# Altium footprint library 3M THD.PcbLib: 163 footprints (part 12 of 14) (continued)
## 3M_N3764-6302RB [mm] "3M, 3000 Series, 64 Contacts - Pitch 2.54mm - Straight Four-Wall Header (Black) With Long Roll Pin Latch/Ejectors" (continued)
  text "64" at 40.605,1.727 h1.02
  text "1" at -41.707,-2.921 h1.02
3D body "3M_N3764-6302RB.stp": height 19.96, standoff -2.84, extent -61.419,-4.318 61.419,4.318

## 3M_N3764-6302RB_a [mm] "3M, 3000 Series, 64 Contacts - Pitch 2.54mm - Straight Four-Wall Header (Black) With Long Roll Pin Latch/Ejectors"
height 27.2
pads (66):
  round 1.6 hole 0.9: 1(-39.37,-1.27) 2(-39.37,1.27) 3(-36.83,-1.27) 4(-36.83,1.27) 5(-34.29,-1.27) 6(-34.29,1.27) 7(-31.75,-1.27) 8(-31.75,1.27) 9(-29.21,-1.27) 10(-29.21,1.27) 11(-26.67,-1.27) 12(-26.67,1.27) 13(-24.13,-1.27) 14(-24.13,1.27) 15(-21.59,-1.27) 16(-21.59,1.27) 17(-19.05,-1.27) 18(-19.05,1.27) 19(-16.51,-1.27) 20(-16.51,1.27) 21(-13.97,-1.27) 22(-13.97,1.27) 23(-11.43,-1.27) 24(-11.43,1.27) 25(-8.89,-1.27) 26(-8.89,1.27) 27(-6.35,-1.27) 28(-6.35,1.27) 29(-3.81,-1.27) 30(-3.81,1.27) 31(-1.27,-1.27) 32(-1.27,1.27) 33(1.27,-1.27) 34(1.27,1.27) 35(3.81,-1.27) 36(3.81,1.27) 37(6.35,-1.27) 38(6.35,1.27) 39(8.89,-1.27) 40(8.89,1.27) 41(11.43,-1.27) 42(11.43,1.27) 43(13.97,-1.27) 44(13.97,1.27) 45(16.51,-1.27) 46(16.51,1.27) 47(19.05,-1.27) 48(19.05,1.27) 49(21.59,-1.27) 50(21.59,1.27) 51(24.13,-1.27) 52(24.13,1.27) 53(26.67,-1.27) 54(26.67,1.27) 55(29.21,-1.27) 56(29.21,1.27) 57(31.75,-1.27) 58(31.75,1.27) 59(34.29,-1.27) 60(34.29,1.27) 61(36.83,-1.27) 62(36.83,1.27) 63(39.37,-1.27) 64(39.37,1.27)
  round 4.6 hole 2.6: MTG1(-48.31,-0.254) MTG2(48.31,-0.254)
Top Overlay:
  lines w0.2: -50.292,-2 -50.292,-4.318 50.292,-4.318 50.292,-2 ; -50.292,1.7 -50.292,4.3 50.292,4.3 50.292,1.7 ; -43.307,-3.175 43.307,-3.175 43.307,3.175 -43.307,3.175 -43.307,-3.175 ; -40.64,-3.175 -39.37,-4.318 -38.1,-3.175 -40.64,-3.175
  text "1" at -41.707,-2.921 h1.02
  text "64" at 40.605,1.727 h1.02
Mechanical 8:
  drawing of 276 lines, arcs and shapes, not listed
Mechanical 14:
  circle w0.1: c-48.324,-0.254 r1.27
  circle w0.1: c48.324,-0.254 r1.27
  lines w0.1: -50.292,-3.175 -46.964,-3.175 ; -49.324,-0.254 -48.324,-0.254 ; -48.324,-1.254 -48.324,-0.254 ; -48.324,0.746 -48.324,-0.254 ; -47.324,-0.254 -48.324,-0.254 ; -46.964,-4.318 -46.964,-1.727 ; -46.964,1.27 -46.964,4.318 ; -46.122,-4.318 -46.122,-1.727 ; -46.122,1.27 -46.122,4.318 ; -43.689,-4.318 -43.688,-1.727 ; -43.307,-1.727 -43.307,-3.175 ; -43.307,1.27 -43.307,3.175 ; -36.519,-4.318 -36.519,-3.175 ; -34.601,-4.318 -34.601,-3.175 ; -3.302,-4.318 -3.302,-3.175 ; 0.762,-4.318 0.762,-3.175 ; 37.141,-4.318 37.141,-3.175 ; 39.059,-4.318 39.059,-3.175 ; 42.846,-4.318 42.846,-3.175 ; 42.846,3.175 42.846,4.318 ; 43.307,-1.727 43.307,-3.175 ; 43.307,1.27 43.307,3.175 ; 43.688,1.27 43.688,4.318 ; 43.729,-4.318 43.729,-1.727 ; 46.122,-4.318 46.122,-1.727 ; 46.122,1.27 46.122,4.318 ; 46.964,-4.318 46.964,-1.727 40.005,-1.727 40.005,1.27 46.964,1.27 46.964,4.318 ; 46.964,-3.175 50.292,-3.175 ; 46.964,3.175 50.292,3.175 ; 47.324,-0.254 48.324,-0.254 ; 48.324,-1.254 48.324,-0.254 ; 48.324,0.746 48.324,-0.254 ; 49.324,-0.254 48.324,-0.254 ; -50.292,-4.318 -50.292,4.318 ; -50.292,-4.318 -50.292,4.318 ; -50.292,-4.318 -50.292,4.318 ; -50.292,-4.318 50.292,-4.318 ; -50.292,4.318 50.292,4.318 ; -43.307,-3.175 -43.307,3.175 ; -43.307,-3.175 -43.307,3.175 ; -43.307,-3.175 43.307,-3.175 ; -43.307,3.175 43.307,3.175 ; 43.307,-3.175 43.307,3.175 ; 43.307,-3.175 43.307,3.175 ; 50.292,-4.318 50.292,4.318 ; 50.292,-4.318 50.292,4.318 ; -50.292,3.175 -46.964,3.175 -50.292,3.175 ; -49.848,-1.134 -49.848,0.626 -48.324,1.506 -46.8,0.626 -46.8,-1.134 -48.324,-2.014 -49.848,-1.134 ; -43.688,1.27 -43.688,4.318 -43.688,1.27 ; -42.846,-4.318 -42.846,-3.175 -42.846,-4.318 ; -42.846,3.175 -42.846,4.318 -42.846,3.175 ; 46.8,-1.134 46.8,0.626 48.324,1.506 49.848,0.626 49.848,-1.134 48.324,-2.014 46.8,-1.134
  text "1" at -41.707,-2.921 h1.02
  text "64" at 40.605,1.727 h1.02
3D body "3M_N3764-6302RB_a.stp": height 27.18, standoff -2.84, extent -50.292,-4.318 50.292,4.318

## 3M_N3764-D302RB [mm] "3M, 3000 Series, 2x64 Contacts - Pitch 2.54mm - Right Angle Four-Wall Condo Header (Black) With Long Roll Pin Latch/Ejectors"
height 15.5
pads (130):
  round 1.7 hole 1: 1L(-39.37,1.27) 1U(-39.37,-3.81) 2L(-39.37,3.81) 2U(-39.37,-1.27) 3L(-36.83,1.27) 3U(-36.83,-3.81) 4L(-36.83,3.81) 4U(-36.83,-1.27) 5L(-34.29,1.27) 5U(-34.29,-3.81) 6L(-34.29,3.81) 6U(-34.29,-1.27) 7L(-31.75,1.27) 7U(-31.75,-3.81) 8L(-31.75,3.81) 8U(-31.75,-1.27) 9L(-29.21,1.27) 9U(-29.21,-3.81) 10L(-29.21,3.81) 10U(-29.21,-1.27) 11L(-26.67,1.27) 11U(-26.67,-3.81) 12L(-26.67,3.81) 12U(-26.67,-1.27) 13L(-24.13,1.27) 13U(-24.13,-3.81) 14L(-24.13,3.81) 14U(-24.13,-1.27) 15L(-21.59,1.27) 15U(-21.59,-3.81) 16L(-21.59,3.81) 16U(-21.59,-1.27) 17L(-19.05,1.27) 17U(-19.05,-3.81) 18L(-19.05,3.81) 18U(-19.05,-1.27) 19L(-16.51,1.27) 19U(-16.51,-3.81) 20L(-16.51,3.81) 20U(-16.51,-1.27) 21L(-13.97,1.27) 21U(-13.97,-3.81) 22L(-13.97,3.81) 22U(-13.97,-1.27) 23L(-11.43,1.27) 23U(-11.43,-3.81) 24L(-11.43,3.81) 24U(-11.43,-1.27) 25L(-8.89,1.27) 25U(-8.89,-3.81) 26L(-8.89,3.81) 26U(-8.89,-1.27) 27L(-6.35,1.27) 27U(-6.35,-3.81) 28L(-6.35,3.81) 28U(-6.35,-1.27) 29L(-3.81,1.27) 29U(-3.81,-3.81) 30L(-3.81,3.81) 30U(-3.81,-1.27) 31L(-1.27,1.27) 31U(-1.27,-3.81) 32L(-1.27,3.81) 32U(-1.27,-1.27) 33L(1.27,1.27) 33U(1.27,-3.81) 34L(1.27,3.81) 34U(1.27,-1.27) 35L(3.81,1.27) 35U(3.81,-3.81) 36L(3.81,3.81) 36U(3.81,-1.27) 37L(6.35,1.27) 37U(6.35,-3.81) 38L(6.35,3.81) 38U(6.35,-1.27) 39L(8.89,1.27) 39U(8.89,-3.81) 40L(8.89,3.81) 40U(8.89,-1.27) 41L(11.43,1.27) 41U(11.43,-3.81) 42L(11.43,3.81) 42U(11.43,-1.27) 43L(13.97,1.27) 43U(13.97,-3.81) 44L(13.97,3.81) 44U(13.97,-1.27) 45L(16.51,1.27) 45U(16.51,-3.81) 46L(16.51,3.81) 46U(16.51,-1.27) 47L(19.05,1.27) 47U(19.05,-3.81) 48L(19.05,3.81) 48U(19.05,-1.27) 49L(21.59,1.27) 49U(21.59,-3.81) 50L(21.59,3.81) 50U(21.59,-1.27) 51L(24.13,1.27) 51U(24.13,-3.81) 52L(24.13,3.81) 52U(24.13,-1.27) 53L(26.67,1.27) 53U(26.67,-3.81) 54L(26.67,3.81) 54U(26.67,-1.27) 55L(29.21,1.27) 55U(29.21,-3.81) 56L(29.21,3.81) 56U(29.21,-1.27) 57L(31.75,1.27) 57U(31.75,-3.81) 58L(31.75,3.81) 58U(31.75,-1.27) 59L(34.29,1.27) 59U(34.29,-3.81) 60L(34.29,3.81) 60U(34.29,-1.27) 61L(36.83,1.27) 61U(36.83,-3.81) 62L(36.83,3.81) 62U(36.83,-1.27) 63L(39.37,1.27) 63U(39.37,-3.81) 64L(39.37,3.81) 64U(39.37,-1.27)
  round 4.6 hole 2.6: MTG1(-45.275,3.07) MTG2(45.275,3.07)
Top Overlay:
  circle w0.2: c-45.006,8.915 r0.953
  circle w0.2: c-45.006,8.915 r0.953
  circle w0.2: c45.006,8.915 r0.953
  circle w0.2: c45.006,8.915 r0.953
  circle w0.2: c-45.006,8.915 r0.953
  lines w0.2: -58.346,18.815 -48.371,13.056 ; -55.941,13.701 -53.312,18.255 -56.314,19.988 -61.572,16.952 -52.233,11.56 -49.919,8.803 ; -50.34,0.533 -48.88,0.533 ccw(c-48.372,0.533) -47.864,0.533 -47.825,0.533 ; -42.822,0.533 -41.698,0.533 ; -40.656,13.741 -39.386,11.542 -38.849,12.471 ; -2.032,7.645 2.032,7.645 ; 41.132,13.741 ccw(c41.167,15.053) 42.464,14.859 42.894,17.297 43.736,17.297 ccw(c45.006,17.297) 46.17,16.789 47.012,16.789 50.34,7.645 50.34,-5.309 -50.34,-5.309 -50.34,7.645 -47.012,16.789 -46.17,16.789 ccw(c-45.006,17.297) -43.736,17.297 -42.894,17.297 -42.464,14.859 ccw(c-41.167,15.053) -41.132,13.741 -39.107,13.741 -39.107,12.471 -37.189,12.471 -37.189,13.741 -2.032,13.741 -2.032,6.121 2.032,6.121 2.032,13.741 25.759,13.741 25.759,12.471 27.677,12.471 27.677,13.741 41.167,13.741 ; 41.698,0.533 42.822,0.533 ; 47.825,0.533 47.864,0.533 ccw(c48.372,0.533) 48.88,0.533 50.34,0.533 ; 48.371,13.056 58.346,18.815 ; 49.919,8.803 52.233,11.56 61.572,16.952 56.314,19.988 53.312,18.255 55.941,13.701
  text "1" at -41.402,-4.24 h1.02
  text "UPPER" at -46.88,-4.25 h1
  text "LOWER" at -40.255,5.475 h1
  text "1" at -41.402,0.84 h1.02
  text "64" at 40.63,-1.651 h1.02
  text "64" at 40.63,3.429 h1.02
Mechanical 8:
  drawing of 523 lines, arcs and shapes, not listed
Mechanical 14:
  circle w0.1: c45.006,8.915 r0.953
  circle w0.1: c-45.006,8.915 r0.953
  circle w0.1: c45.275,3.07 r1.27
  circle w0.1: c-45.275,3.07 r1.27
  lines w0.1: -58.346,18.815 -48.371,13.056 ; -55.941,13.701 -53.312,18.255 -56.314,19.988 -61.572,16.952 -52.233,11.56 -49.919,8.803 ; -50.34,0.533 -48.88,0.533 ccw(c-48.372,0.533) -47.864,0.533 -47.825,0.533 -47.825,4.518 -45.324,5.962 -42.822,4.518 -42.822,0.533 42.822,0.533 42.822,4.518 45.324,5.962 47.825,4.518 47.825,0.533 47.864,0.533 ccw(c48.372,0.533) 48.88,0.533 50.34,0.533 ; -40.656,13.741 -39.386,11.542 -38.849,12.471 ; -25.908,0.533 ccw(c-25.4,0.533) -24.892,0.533 ; -6.858,0.533 ccw(c-6.35,0.533) -5.842,0.533 ; -2.032,7.645 2.032,7.645 ; 5.842,0.533 ccw(c6.35,0.533) 6.858,0.533 ; 24.892,0.533 ccw(c25.4,0.533) 25.908,0.533 ; 41.132,13.741 ccw(c41.167,15.053) 42.464,14.859 42.894,17.297 43.736,17.297 ccw(c45.006,17.297) 46.17,16.789 47.012,16.789 50.34,7.645 50.34,-5.309 -50.34,-5.309 -50.34,7.645 -47.012,16.789 -46.17,16.789 ccw(c-45.006,17.297) -43.736,17.297 -42.894,17.297 -42.464,14.859 ccw(c-41.167,15.053) -41.132,13.741 -39.107,13.741 -39.107,12.471 -37.189,12.471 -37.189,13.741 -2.032,13.741 -2.032,6.121 2.032,6.121 2.032,13.741 25.759,13.741 25.759,12.471 27.677,12.471 27.677,13.741 41.167,13.741 ; 48.371,13.056 58.346,18.815 ; 49.919,8.803 52.233,11.56 61.572,16.952 56.314,19.988 53.312,18.255 55.941,13.701
  text "1" at -41.402,-4.24 h1.02
  text "1" at -41.402,-4.24 h1.02
  text "UPPER" at -46.88,-4.25 h1
  text "LOWER" at -40.255,5.475 h1
  text "1" at -41.402,0.84 h1.02
  text "64" at 40.63,3.429 h1.02
  text "64" at 40.63,-1.651 h1.02
3D body "3M_N3764-D302RB.stp": height 15.49, standoff -2.84, extent -61.466,-5.308 61.471,19.988

## 3M_N3764-D302RB_a [mm] "3M, 3000 Series, 2x64 Contacts - Pitch 2.54mm - Right Angle Four-Wall Condo Header (Black) With Long Roll Pin Latch/Ejectors"
height 15.5
pads (130):
  round 1.7 hole 1: 1L(-39.37,1.27) 1U(-39.37,-3.81) 2L(-39.37,3.81) 2U(-39.37,-1.27) 3L(-36.83,1.27) 3U(-36.83,-3.81) 4L(-36.83,3.81) 4U(-36.83,-1.27) 5L(-34.29,1.27) 5U(-34.29,-3.81) 6L(-34.29,3.81) 6U(-34.29,-1.27) 7L(-31.75,1.27) 7U(-31.75,-3.81) 8L(-31.75,3.81) 8U(-31.75,-1.27) 9L(-29.21,1.27) 9U(-29.21,-3.81) 10L(-29.21,3.81) 10U(-29.21,-1.27) 11L(-26.67,1.27) 11U(-26.67,-3.81) 12L(-26.67,3.81) 12U(-26.67,-1.27) 13L(-24.13,1.27) 13U(-24.13,-3.81) 14L(-24.13,3.81) 14U(-24.13,-1.27) 15L(-21.59,1.27) 15U(-21.59,-3.81) 16L(-21.59,3.81) 16U(-21.59,-1.27) 17L(-19.05,1.27) 17U(-19.05,-3.81) 18L(-19.05,3.81) 18U(-19.05,-1.27) 19L(-16.51,1.27) 19U(-16.51,-3.81) 20L(-16.51,3.81) 20U(-16.51,-1.27) 21L(-13.97,1.27) 21U(-13.97,-3.81) 22L(-13.97,3.81) 22U(-13.97,-1.27) 23L(-11.43,1.27) 23U(-11.43,-3.81) 24L(-11.43,3.81) 24U(-11.43,-1.27) 25L(-8.89,1.27) 25U(-8.89,-3.81) 26L(-8.89,3.81) 26U(-8.89,-1.27) 27L(-6.35,1.27) 27U(-6.35,-3.81) 28L(-6.35,3.81) 28U(-6.35,-1.27) 29L(-3.81,1.27) 29U(-3.81,-3.81) 30L(-3.81,3.81) 30U(-3.81,-1.27) 31L(-1.27,1.27) 31U(-1.27,-3.81) 32L(-1.27,3.81) 32U(-1.27,-1.27) 33L(1.27,1.27) 33U(1.27,-3.81) 34L(1.27,3.81) 34U(1.27,-1.27) 35L(3.81,1.27) 35U(3.81,-3.81) 36L(3.81,3.81) 36U(3.81,-1.27) 37L(6.35,1.27) 37U(6.35,-3.81) 38L(6.35,3.81) 38U(6.35,-1.27) 39L(8.89,1.27) 39U(8.89,-3.81) 40L(8.89,3.81) 40U(8.89,-1.27) 41L(11.43,1.27) 41U(11.43,-3.81) 42L(11.43,3.81) 42U(11.43,-1.27) 43L(13.97,1.27) 43U(13.97,-3.81) 44L(13.97,3.81) 44U(13.97,-1.27) 45L(16.51,1.27) 45U(16.51,-3.81) 46L(16.51,3.81) 46U(16.51,-1.27) 47L(19.05,1.27) 47U(19.05,-3.81) 48L(19.05,3.81) 48U(19.05,-1.27) 49L(21.59,1.27) 49U(21.59,-3.81) 50L(21.59,3.81) 50U(21.59,-1.27) 51L(24.13,1.27) 51U(24.13,-3.81) 52L(24.13,3.81) 52U(24.13,-1.27) 53L(26.67,1.27) 53U(26.67,-3.81) 54L(26.67,3.81) 54U(26.67,-1.27) 55L(29.21,1.27) 55U(29.21,-3.81) 56L(29.21,3.81) 56U(29.21,-1.27) 57L(31.75,1.27) 57U(31.75,-3.81) 58L(31.75,3.81) 58U(31.75,-1.27) 59L(34.29,1.27) 59U(34.29,-3.81) 60L(34.29,3.81) 60U(34.29,-1.27) 61L(36.83,1.27) 61U(36.83,-3.81) 62L(36.83,3.81) 62U(36.83,-1.27) 63L(39.37,1.27) 63U(39.37,-3.81) 64L(39.37,3.81) 64U(39.37,-1.27)
  round 4.6 hole 2.6: MTG1(-45.275,3.07) MTG2(45.275,3.07)
Top Overlay:
  circle w0.2: c-45.006,8.915 r0.953
  circle w0.2: c45.006,8.915 r0.953
  circle w0.2: c45.006,8.915 r0.953
  circle w0.2: c-45.006,8.915 r0.953
  circle w0.2: c-45.006,8.915 r0.953
  lines w0.2: -50.34,0.533 -48.88,0.533 ccw(c-48.372,0.533) -47.864,0.533 -47.825,0.533 ; -46.327,20.775 -41.069,20.775 -41.069,24.242 -46.327,27.277 -46.327,16.789 -46.327,24.74 ; -43.101,17.297 -43.101,25.415 ; -42.822,0.533 -41.698,0.533 ; -40.656,13.741 -39.386,11.542 -38.849,12.471 ; -2.032,7.645 2.032,7.645 ; 41.132,13.741 ccw(c41.167,15.053) 42.464,14.859 42.894,17.297 43.736,17.297 ; 41.167,13.741 27.677,13.741 27.677,12.471 25.759,12.471 25.759,13.741 2.032,13.741 2.032,6.121 -2.032,6.121 -2.032,13.741 -37.189,13.741 -37.189,12.471 -39.107,12.471 -39.107,13.741 -41.132,13.741 cw(c-41.167,15.053) -42.464,14.859 -42.894,17.297 -43.736,17.297 cw(c-45.006,17.297) -46.17,16.789 -47.012,16.789 -50.34,7.645 -50.34,-5.309 50.34,-5.309 50.34,7.645 47.012,16.789 46.17,16.789 ; 41.698,0.533 42.822,0.533 ; 43.101,17.297 43.101,25.415 ; 46.327,16.789 46.327,27.277 41.069,24.242 41.069,20.775 46.327,20.775 ; 47.825,0.533 47.864,0.533 ccw(c48.372,0.533) 48.88,0.533 50.34,0.533 ; 43.736,17.297 ccw(c45.006,17.297) 46.17,16.789 ; 43.736,17.297 ccw(c45.006,17.297) 46.17,16.789
  text "64" at 40.63,3.429 h1.02
  text "64" at 40.63,-1.651 h1.02
  text "1" at -41.402,0.84 h1.02
  text "LOWER" at -40.255,5.475 h1
  text "UPPER" at -46.88,-4.25 h1
  text "1" at -41.402,-4.24 h1.02
Mechanical 8:
  drawing of 523 lines, arcs and shapes, not listed
Mechanical 14:
  circle w0.1: c-45.275,3.07 r1.27
  circle w0.1: c45.275,3.07 r1.27
  circle w0.1: c-45.006,8.915 r0.953
  circle w0.1: c45.006,8.915 r0.953
  lines w0.1: -50.34,0.533 -48.88,0.533 ccw(c-48.372,0.533) -47.864,0.533 -47.825,0.533 -47.825,4.518 -45.324,5.962 -42.822,4.518 -42.822,0.533 42.822,0.533 42.822,4.518 45.324,5.962 47.825,4.518 47.825,0.533 47.864,0.533 ccw(c48.372,0.533) 48.88,0.533 50.34,0.533 ; -46.327,20.775 -41.069,20.775 -41.069,24.242 -46.327,27.277 -46.327,16.789 -46.327,24.74 ; -43.101,17.297 -43.101,25.415 ; -40.656,13.741 -39.386,11.542 -38.849,12.471 ; -25.908,0.533 ccw(c-25.4,0.533) -24.892,0.533 ; -6.858,0.533 ccw(c-6.35,0.533) -5.842,0.533 ; -2.032,7.645 2.032,7.645 ; 5.842,0.533 ccw(c6.35,0.533) 6.858,0.533 ; 24.892,0.533 ccw(c25.4,0.533) 25.908,0.533 ; 41.132,13.741 ccw(c41.167,15.053) 42.464,14.859 42.894,17.297 43.736,17.297 ; 41.167,13.741 27.677,13.741 27.677,12.471 25.759,12.471 25.759,13.741 2.032,13.741 2.032,6.121 -2.032,6.121 -2.032,13.741 -37.189,13.741 -37.189,12.471 -39.107,12.471 -39.107,13.741 -41.132,13.741 cw(c-41.167,15.053) -42.464,14.859 -42.894,17.297 -43.736,17.297 cw(c-45.006,17.297) -46.17,16.789 -47.012,16.789 -50.34,7.645 -50.34,-5.309 50.34,-5.309 50.34,7.645 47.012,16.789 46.17,16.789 ; 43.101,17.297 43.101,25.415 ; 46.327,16.789 46.327,27.277 41.069,24.242 41.069,20.775 46.327,20.775 ; 43.736,17.297 ccw(c45.006,17.297) 46.17,16.789 ; 43.736,17.297 ccw(c45.006,17.297) 46.17,16.789
  text "64" at 40.63,-1.651 h1.02
  text "64" at 40.63,3.429 h1.02
  text "1" at -41.402,0.84 h1.02
  text "LOWER" at -40.255,5.475 h1
  text "UPPER" at -46.88,-4.25 h1
  text "1" at -41.402,-4.24 h1.02
  text "1" at -41.402,-4.24 h1.02
3D body "3M_N3764-D302RB_a.stp": height 15.49, standoff -2.84, extent -50.34,-5.308 50.34,27.206

## 3M_N3793-5202RB [mm] "3M, 3000 Series, 10 Contacts - Pitch 2.54mm - Right Angle Four-Wall Header (Black) With Short Roll Pin Latch/Ejectors"
height 8.6
pads (12):
  round 1.6 hole 0.9: 1(-5.08,-1.27) 2(-5.08,1.27) 3(-2.54,-1.27) 4(-2.54,1.27) 5(0,-1.27) 6(0,1.27) 7(2.54,-1.27) 8(2.54,1.27) 9(5.08,-1.27) 10(5.08,1.27)
  round 4.6 hole 2.8: MTG1(-10.985,0.53) MTG2(10.985,0.53)
Top Overlay:
  circle w0.35: c-5.153,-3.048 r0.15
  circle w0.2: c10.681,6.375 r0.953
  circle w0.2: c-10.655,6.375 r0.953
  lines w0.2: -19.394,9.877 -16.816,14.342 ccw(c-16.904,14.393) -16.853,14.481 -19.768,16.163 -24.873,13.216 ccw(c-24.822,13.128) -24.873,13.04 -17.884,9.005 -15.573,6.25 ; -17.781,12.67 -14.025,10.502 ; -14.491,-2 ccw(c-13.983,-2) -13.475,-2 ; -13.475,-2.007 -15.989,-2.007 -15.989,5.105 -12.661,14.249 -11.819,14.249 ccw(c-10.655,14.757) -9.385,14.757 -8.543,14.757 -8.101,12.251 ccw(c-6.851,12.471) -6.851,11.201 6.876,11.201 ccw(c6.876,12.471) 8.127,12.251 8.569,14.757 9.411,14.757 ccw(c10.681,14.757) 11.845,14.249 12.687,14.249 16.015,5.105 16.015,-2.007 13.5,-2.007 ; -6.267,11.201 -4.997,9.002 -4.461,9.931 ; -4.769,11.201 -4.769,9.931 -2.851,9.931 -2.851,11.201 ; -2.019,5.105 2.045,5.105 ; -2.019,11.201 -2.019,3.581 2.045,3.581 2.045,11.201 ; -1.587,5.105 -1.587,11.201 -0.953,11.201 -0.953,5.105 ; 0.953,5.105 0.953,11.201 1.587,11.201 1.587,5.105 ; 13.492,-2.007 ccw(c14,-2.007) 14.508,-2.007 ; 14.028,10.502 17.784,12.67 ; 15.575,6.25 17.886,9.005 24.876,13.04 ccw(c24.825,13.128) 24.876,13.216 19.77,16.163 16.856,14.481 ccw(c16.907,14.393) 16.819,14.342 19.397,9.877
  text "10" at 6.34,0.889 h1.02
  text "1" at -7.112,-1.7 h1.02
Mechanical 8:
  lines w0.05: -11.485,0.53 -10.985,0.53 ; -10.985,0.03 -10.985,0.53 ; -10.985,1.03 -10.985,0.53 ; -10.485,0.53 -10.985,0.53 ; -5.58,-1.27 -5.08,-1.27 ; -5.58,1.27 -5.08,1.27 ; -5.08,-1.77 -5.08,-1.27 ; -5.08,-0.77 -5.08,-1.27 ; -5.08,0.77 -5.08,1.27 ; -5.08,1.77 -5.08,1.27 ; -4.58,-1.27 -5.08,-1.27 ; -4.58,1.27 -5.08,1.27 ; -3.04,-1.27 -2.54,-1.27 ; -3.04,1.27 -2.54,1.27 ; -2.54,-1.77 -2.54,-1.27 ; -2.54,-0.77 -2.54,-1.27 ; -2.54,0.77 -2.54,1.27 ; -2.54,1.77 -2.54,1.27 ; -2.04,-1.27 -2.54,-1.27 ; -2.04,1.27 -2.54,1.27 ; -0.5,-1.27 0,-1.27 ; -0.5,0 0,0 ; -0.5,1.27 0,1.27 ; 0,-1.77 0,-1.27 ; 0,-0.77 0,-1.27 ; 0,-0.5 0,0 ; 0,0.5 0,0 ; 0,0.77 0,1.27 ; 0,1.77 0,1.27 ; 0.5,-1.27 0,-1.27 ; 0.5,0 0,0 ; 0.5,1.27 0,1.27 ; 2.04,-1.27 2.54,-1.27 ; 2.04,1.27 2.54,1.27 ; 2.54,-1.77 2.54,-1.27 ; 2.54,-0.77 2.54,-1.27 ; 2.54,0.77 2.54,1.27 ; 2.54,1.77 2.54,1.27 ; 3.04,-1.27 2.54,-1.27 ; 3.04,1.27 2.54,1.27 ; 4.58,-1.27 5.08,-1.27 ; 4.58,1.27 5.08,1.27 ; 5.08,-1.77 5.08,-1.27 ; 5.08,-0.77 5.08,-1.27 ; 5.08,0.77 5.08,1.27 ; 5.08,1.77 5.08,1.27 ; 5.58,-1.27 5.08,-1.27 ; 5.58,1.27 5.08,1.27 ; 10.485,0.53 10.985,0.53 ; 10.985,0.03 10.985,0.53 ; 10.985,1.03 10.985,0.53 ; 11.485,0.53 10.985,0.53
Mechanical 14:
  circle w0.1: c10.681,6.375 r0.953
  circle w0.1: c-10.655,6.375 r0.953
  circle w0.1: c10.998,0.533 r1.27
  circle w0.1: c-10.973,0.533 r1.27
  lines w0.1: -19.394,9.877 -16.816,14.342 ccw(c-16.904,14.393) -16.853,14.481 -19.768,16.163 -24.873,13.216 ccw(c-24.822,13.128) -24.873,13.04 -17.884,9.005 -15.573,6.25 ; -17.781,12.67 -14.025,10.502 ; -16.052,-2.007 16.015,-2.007 16.015,5.105 12.687,14.249 11.845,14.249 cw(c10.681,14.757) 9.411,14.757 8.569,14.757 8.127,12.251 cw(c6.876,12.471) 6.876,11.201 -6.851,11.201 cw(c-6.851,12.471) -8.101,12.251 -8.543,14.757 -9.385,14.757 cw(c-10.655,14.757) -11.819,14.249 -12.661,14.249 -15.989,5.105 -15.989,-2.007 ; -14.491,-2.007 ccw(c-13.983,-2.007) -13.475,-2.007 -13.475,1.978 -10.973,3.422 -8.471,1.978 -8.471,-2.007 ; -6.267,11.201 -4.997,9.002 -4.461,9.931 ; -4.769,11.201 -4.769,9.931 -2.851,9.931 -2.851,11.201 ; -4.559,-2.007 7.125,-2.007 ; -2.019,5.105 2.045,5.105 ; -2.019,11.201 -2.019,3.581 2.045,3.581 2.045,11.201 ; -1.587,5.105 -1.587,11.201 -0.953,11.201 -0.953,5.105 ; 0.953,5.105 0.953,11.201 1.587,11.201 1.587,5.105 ; 8.496,-2.007 8.496,1.978 10.998,3.422 13.5,1.978 13.5,-2.007 ; 13.475,-2.007 ccw(c13.983,-2.007) 14.491,-2.007 ; 13.538,-2.007 ccw(c14.046,-2.007) 14.554,-2.007 ; 14.028,10.502 17.784,12.67 ; 15.575,6.25 17.886,9.005 24.876,13.04 ccw(c24.825,13.128) 24.876,13.216 19.77,16.163 16.856,14.481 ccw(c16.907,14.393) 16.819,14.342 19.397,9.877
  text "10" at 6.34,0.889 h1.02
  text "1" at -7.112,-1.7 h1.02
3D body "3M_N3793-5202RB.stp": height 8.64, standoff -2.84, extent -24.918,-2.514 24.944,16.179

## 3M_N3793-5202RB_a [mm] "3M, 3000 Series, 10 Contacts - Pitch 2.54mm - Right Angle Four-Wall Header (Black) With Short Roll Pin Latch/Ejectors"
height 8.6
pads (12):
  round 1.6 hole 0.9: 1(-5.08,-1.27) 2(-5.08,1.27) 3(-2.54,-1.27) 4(-2.54,1.27) 5(0,-1.27) 6(0,1.27) 7(2.54,-1.27) 8(2.54,1.27) 9(5.08,-1.27) 10(5.08,1.27)
  round 4.6 hole 2.8: MTG1(-10.985,0.53) MTG2(10.985,0.53)
Top Overlay:
  circle w0.2: c-10.655,6.375 r0.953
  circle w0.2: c10.681,6.375 r0.953
  circle w0.35: c-5.153,-3.048 r0.15
  lines w0.2: -14.491,-2 ccw(c-13.983,-2) -13.475,-2 ; -13.475,-2.007 -15.989,-2.007 -15.989,5.105 -12.661,14.249 -11.819,14.249 ccw(c-10.655,14.757) -9.385,14.757 -8.543,14.757 -8.101,12.251 ccw(c-6.851,12.471) -6.851,11.201 6.876,11.201 ccw(c6.876,12.471) 8.127,12.251 8.569,14.757 9.411,14.757 ccw(c10.681,14.757) 11.845,14.249 12.687,14.249 16.015,5.105 16.015,-2.007 13.5,-2.007 ; -11.976,14.249 -11.976,22.024 cw(c-11.874,22.024) -11.824,22.112 -6.718,19.164 -6.718,15.799 cw(c-6.82,15.799) -6.82,15.697 -11.976,15.697 ; -8.774,14.757 -8.758,20.341 ; -6.267,11.201 -4.997,9.002 -4.461,9.931 ; -4.769,11.201 -4.769,9.931 -2.851,9.931 -2.851,11.201 ; -2.019,5.105 2.045,5.105 ; -2.019,11.201 -2.019,3.581 2.045,3.581 2.045,11.201 ; -1.587,5.105 -1.587,11.201 -0.953,11.201 -0.953,5.105 ; 0.953,5.105 0.953,11.201 1.587,11.201 1.587,5.105 ; 8.776,14.757 8.776,20.337 ; 12.002,14.249 12.002,22.024 ccw(c11.9,22.024) 11.849,22.112 6.744,19.164 6.744,15.799 ccw(c6.845,15.799) 6.845,15.697 12.002,15.697 ; 13.492,-2.007 ccw(c14,-2.007) 14.508,-2.007
  text "1" at -7.112,-1.7 h1.02
  text "10" at 6.34,0.889 h1.02
Mechanical 8:
  lines w0.05: -11.485,0.53 -10.985,0.53 ; -10.985,0.03 -10.985,0.53 ; -10.985,1.03 -10.985,0.53 ; -10.485,0.53 -10.985,0.53 ; -5.58,-1.27 -5.08,-1.27 ; -5.58,1.27 -5.08,1.27 ; -5.08,-1.77 -5.08,-1.27 ; -5.08,-0.77 -5.08,-1.27 ; -5.08,0.77 -5.08,1.27 ; -5.08,1.77 -5.08,1.27 ; -4.58,-1.27 -5.08,-1.27 ; -4.58,1.27 -5.08,1.27 ; -3.04,-1.27 -2.54,-1.27 ; -3.04,1.27 -2.54,1.27 ; -2.54,-1.77 -2.54,-1.27 ; -2.54,-0.77 -2.54,-1.27 ; -2.54,0.77 -2.54,1.27 ; -2.54,1.77 -2.54,1.27 ; -2.04,-1.27 -2.54,-1.27 ; -2.04,1.27 -2.54,1.27 ; -0.5,-1.27 0,-1.27 ; -0.5,0 0,0 ; -0.5,1.27 0,1.27 ; 0,-1.77 0,-1.27 ; 0,-0.77 0,-1.27 ; 0,-0.5 0,0 ; 0,0.5 0,0 ; 0,0.77 0,1.27 ; 0,1.77 0,1.27 ; 0.5,-1.27 0,-1.27 ; 0.5,0 0,0 ; 0.5,1.27 0,1.27 ; 2.04,-1.27 2.54,-1.27 ; 2.04,1.27 2.54,1.27 ; 2.54,-1.77 2.54,-1.27 ; 2.54,-0.77 2.54,-1.27 ; 2.54,0.77 2.54,1.27 ; 2.54,1.77 2.54,1.27 ; 3.04,-1.27 2.54,-1.27 ; 3.04,1.27 2.54,1.27 ; 4.58,-1.27 5.08,-1.27 ; 4.58,1.27 5.08,1.27 ; 5.08,-1.77 5.08,-1.27 ; 5.08,-0.77 5.08,-1.27 ; 5.08,0.77 5.08,1.27 ; 5.08,1.77 5.08,1.27 ; 5.58,-1.27 5.08,-1.27 ; 5.58,1.27 5.08,1.27 ; 10.485,0.53 10.985,0.53 ; 10.985,0.03 10.985,0.53 ; 10.985,1.03 10.985,0.53 ; 11.485,0.53 10.985,0.53
Mechanical 14:
  circle w0.1: c-10.973,0.533 r1.27
  circle w0.1: c10.998,0.533 r1.27
  circle w0.1: c-10.655,6.375 r0.953
  circle w0.1: c10.681,6.375 r0.953
  lines w0.1: -16.052,-2.007 16.015,-2.007 16.015,5.105 12.687,14.249 11.845,14.249 cw(c10.681,14.757) 9.411,14.757 8.569,14.757 8.127,12.251 cw(c6.876,12.471) 6.876,11.201 -6.851,11.201 cw(c-6.851,12.471) -8.101,12.251 -8.543,14.757 -9.385,14.757 cw(c-10.655,14.757) -11.819,14.249 -12.661,14.249 -15.989,5.105 -15.989,-2.007 ; -14.491,-2.007 ccw(c-13.983,-2.007) -13.475,-2.007 -13.475,1.978 -10.973,3.422 -8.471,1.978 -8.471,-2.007 ; -11.976,14.249 -11.976,22.024 cw(c-11.874,22.024) -11.824,22.112 -6.718,19.164 -6.718,15.799 cw(c-6.82,15.799) -6.82,15.697 -11.976,15.697 ; -8.774,14.757 -8.758,20.341 ; -6.267,11.201 -4.997,9.002 -4.461,9.931 ; -4.769,11.201 -4.769,9.931 -2.851,9.931 -2.851,11.201 ; -4.559,-2.007 7.125,-2.007 ; -2.019,5.105 2.045,5.105 ; -2.019,11.201 -2.019,3.581 2.045,3.581 2.045,11.201 ; -1.587,5.105 -1.587,11.201 -0.953,11.201 -0.953,5.105 ; 0.953,5.105 0.953,11.201 1.587,11.201 1.587,5.105 ; 8.496,-2.007 8.496,1.978 10.998,3.422 13.5,1.978 13.5,-2.007 ; 8.776,14.757 8.776,20.337 ; 12.002,14.249 12.002,22.024 ccw(c11.9,22.024) 11.849,22.112 6.744,19.164 6.744,15.799 ccw(c6.845,15.799) 6.845,15.697 12.002,15.697 ; 13.475,-2.007 ccw(c13.983,-2.007) 14.491,-2.007 ; 13.538,-2.007 ccw(c14.046,-2.007) 14.554,-2.007
  text "1" at -7.112,-1.7 h1.02
  text "10" at 6.34,0.889 h1.02
3D body "3M_N3793-5202RB_a.stp": height 8.64, standoff -2.84, extent -16.002,-2.514 16.002,22.136